# Altium footprint library cat.PcbLib: 78 footprints (part 4 of 5)
Each footprint in its own frame and in the unit in brackets; x right, y up, seen from the top. Pads: shape width x height; smd on the part's side, far side on the other; paste and mask are expansions set on the pad; w line width, h text height; cw(c..) or ccw(c..) is an arc to the next point about the centre after c.
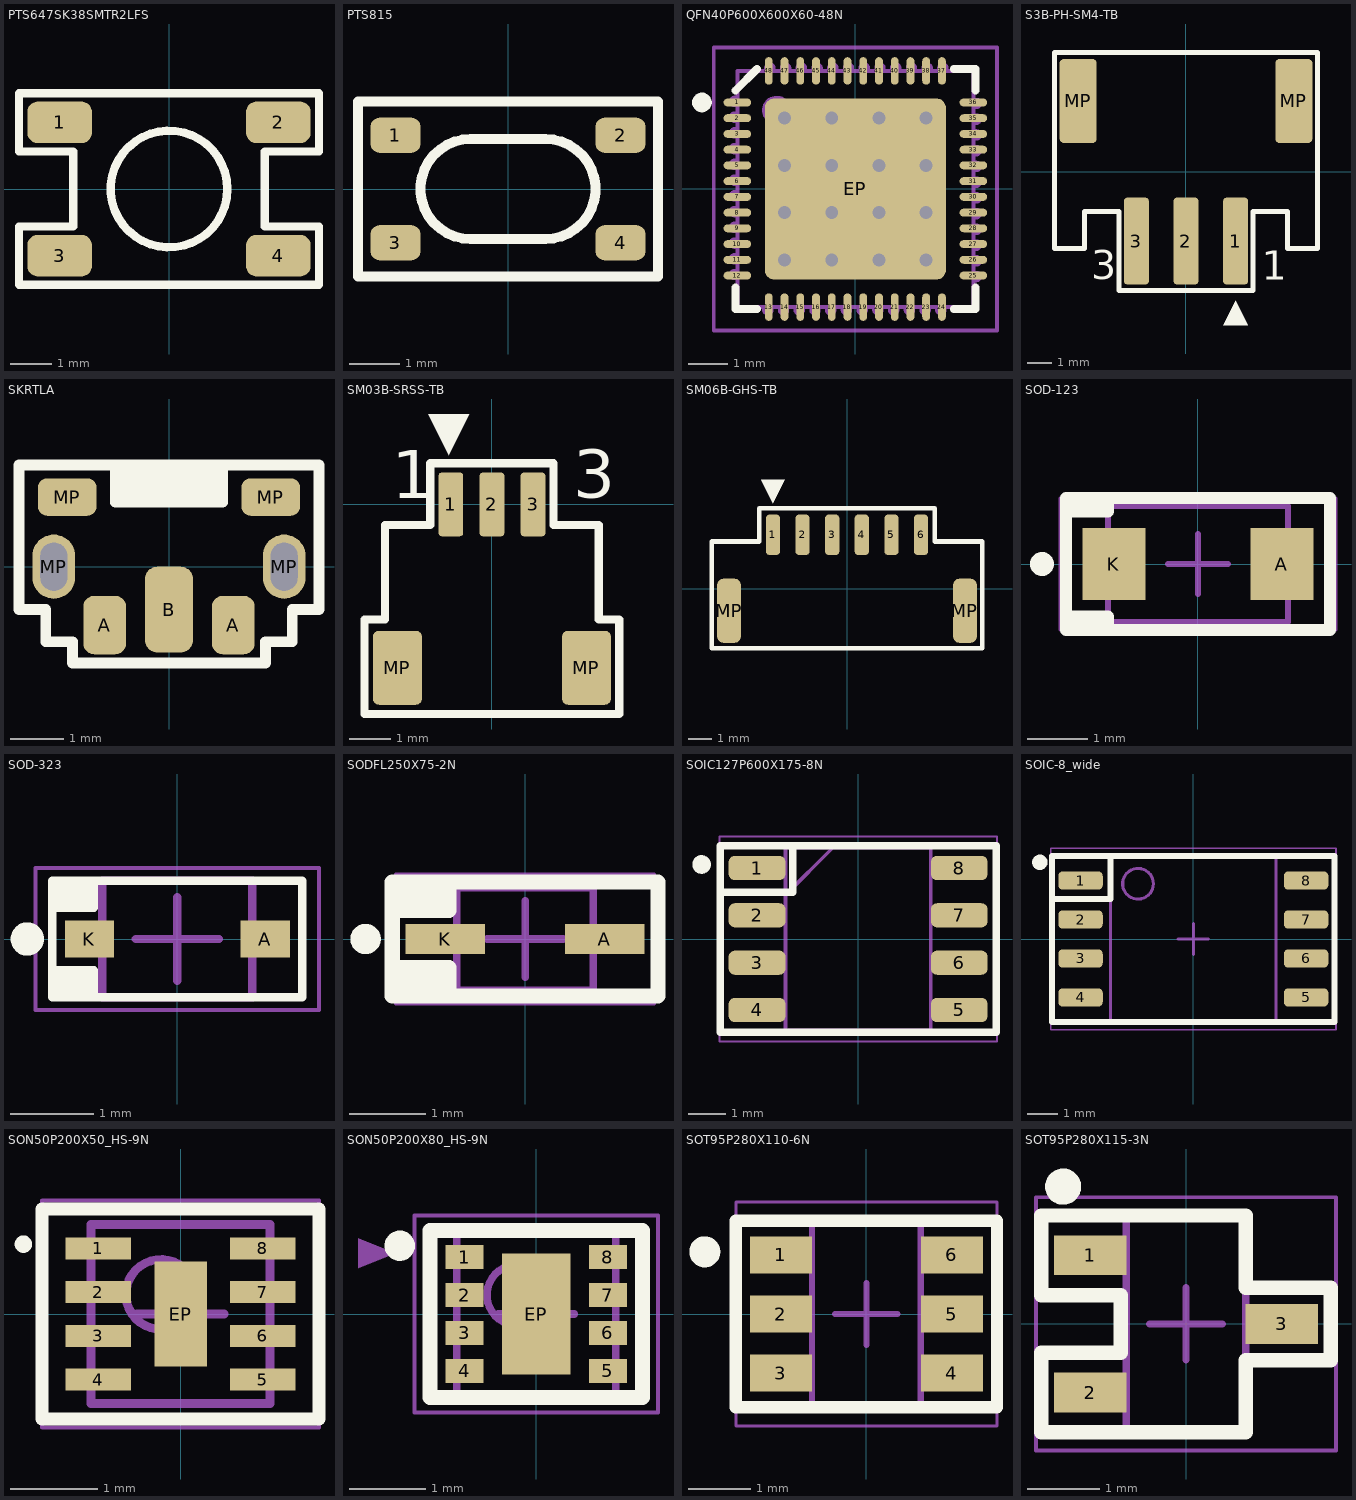
[diagram p3: the footprints below, top view; thin cyan lines are the x and y axes]

## PTS647SK38SMTR2LFS [mm]
pads (4):
  rrect50% 1.55x1 smd: 1(-2.625,1.6) 2(2.625,1.6) 3(-2.625,-1.6) 4(2.625,-1.6)
Top Overlay:
  circle w0.2: c0,0 r1.4
  lines w0.2: -3.6,-2.3 -3.6,-0.9 -2.3,-0.9 -2.3,0.9 -3.6,0.9 -3.6,2.3 3.6,2.3 3.6,0.9 2.3,0.9 2.3,-0.9 3.6,-0.9 3.6,-2.3 -3.6,-2.3
3D body "pts647sk38Smtr2lfs.step": height 3.8, standoff 0, extent -3.25,-2.25 3.25,2.25

## PTS815 [mm]
pads (4):
  rrect50% 1x0.7 smd: 1(-2.25,1.075) 2(2.25,1.075) 3(-2.25,-1.075) 4(2.25,-1.075)
Top Overlay:
  lines w0.2: -3,-1.75 3,-1.75 3,1.75 -3,1.75 -3,-1.75 ; -0.75,-1 cw(c-0.75,0) -0.75,1 0.75,1 cw(c0.75,0) 0.75,-1 -0.75,-1
3D body "PTS815.stp": height 2.5, standoff 0, extent -2.25,-1.6 2.25,1.6

## QFN40P600X600X60-48N [mm] "QFN, 48-Leads, Body 6.1x6.1mm (max), Pitch 0.40mm, IPC Medium Density"
height 0.6
pads (49):
  oval 0.7x0.2 smd: 1(-3,2.2) 2(-3,1.8) 3(-3,1.4) 4(-3,1) 5(-3,0.6) 6(-3,0.2) 7(-3,-0.2) 8(-3,-0.6) 9(-3,-1) 10(-3,-1.4) 11(-3,-1.8) 12(-3,-2.2) 25(3,-2.2) 26(3,-1.8) 27(3,-1.4) 28(3,-1) 29(3,-0.6) 30(3,-0.2) 31(3,0.2) 32(3,0.6) 33(3,1) 34(3,1.4) 35(3,1.8) 36(3,2.2)
  oval 0.2x0.7 smd: 13(-2.2,-3) 14(-1.8,-3) 15(-1.4,-3) 16(-1,-3) 17(-0.6,-3) 18(-0.2,-3) 19(0.2,-3) 20(0.6,-3) 21(1,-3) 22(1.4,-3) 23(1.8,-3) 24(2.2,-3) 37(2.2,3) 38(1.8,3) 39(1.4,3) 40(1,3) 41(0.6,3) 42(0.2,3) 43(-0.2,3) 44(-0.6,3) 45(-1,3) 46(-1.4,3) 47(-1.8,3) 48(-2.2,3)
  rrect10% 4.6x4.6 smd: EP(0,0)
via 1.8,-1.8 diameter 0.66 hole 0.33
via 0.6,-1.8 diameter 0.66 hole 0.33
via -0.6,-1.8 diameter 0.66 hole 0.33
via -1.8,-1.8 diameter 0.66 hole 0.33
via 1.8,-0.6 diameter 0.66 hole 0.33
via 0.6,-0.6 diameter 0.66 hole 0.33
via -0.6,-0.6 diameter 0.66 hole 0.33
via -1.8,-0.6 diameter 0.66 hole 0.33
via 1.8,0.6 diameter 0.66 hole 0.33
via 0.6,0.6 diameter 0.66 hole 0.33
via -0.6,0.6 diameter 0.66 hole 0.33
via -1.8,0.6 diameter 0.66 hole 0.33
via 1.8,1.8 diameter 0.66 hole 0.33
via 0.6,1.8 diameter 0.66 hole 0.33
via -0.6,1.8 diameter 0.66 hole 0.33
via -1.8,1.8 diameter 0.66 hole 0.33
Top Overlay:
  circle w0.25: c-3.9,2.2 r0.125
  lines w0.2: -3.05,-2.5 -3.05,-3.05 -2.5,-3.05 ; -3.05,2.5 -2.5,3.05 ; 2.5,-3.05 3.05,-3.05 3.05,-2.5 ; 2.5,3.05 3.05,3.05 3.05,2.5
Bottom Courtyard:
  circle w0.1: c-2,2 r0.32
  lines w0.1: -3,-2.269 -3.071,-2.269 cw(c-3.071,-2.174) -3.071,-2.079 -3,-2.079 ; -3,-1.869 -3.071,-1.869 cw(c-3.071,-1.774) -3.071,-1.679 -3,-1.679 ; -3,-1.469 -3.071,-1.469 cw(c-3.071,-1.374) -3.071,-1.279 -3,-1.279 ; -3,-1.069 -3.071,-1.069 cw(c-3.071,-0.974) -3.071,-0.879 -3,-0.879 ; -3,-0.669 -3.071,-0.669 cw(c-3.071,-0.574) -3.071,-0.479 -3,-0.479 ; -3,-0.269 -3.071,-0.269 cw(c-3.071,-0.174) -3.071,-0.079 -3,-0.079 ; -3,0.131 -3.071,0.131 cw(c-3.071,0.226) -3.071,0.321 -3,0.321 ; -3,0.531 -3.071,0.531 cw(c-3.071,0.626) -3.071,0.721 -3,0.721 ; -3,0.931 -3.071,0.931 cw(c-3.071,1.026) -3.071,1.121 -3,1.121 ; -3,1.331 -3.071,1.331 cw(c-3.071,1.426) -3.071,1.521 -3,1.521 ; -3,1.731 -3.071,1.731 cw(c-3.071,1.826) -3.071,1.921 -3,1.921 ; -3,2.131 -3.071,2.131 cw(c-3.071,2.226) -3.071,2.321 -3,2.321 ; -2.321,-3 -2.321,-3.071 ccw(c-2.226,-3.071) -2.131,-3.071 -2.131,-3 ; -2.269,3 -2.269,3.071 cw(c-2.174,3.071) -2.079,3.071 -2.079,3 ; -1.921,-3 -1.921,-3.071 ccw(c-1.826,-3.071) -1.731,-3.071 -1.731,-3 ; -1.869,3 -1.869,3.071 cw(c-1.774,3.071) -1.679,3.071 -1.679,3 ; -1.521,-3 -1.521,-3.071 ccw(c-1.426,-3.071) -1.331,-3.071 -1.331,-3 ; -1.469,3 -1.469,3.071 cw(c-1.374,3.071) -1.279,3.071 -1.279,3 ; -1.121,-3 -1.121,-3.071 ccw(c-1.026,-3.071) -0.931,-3.071 -0.931,-3 ; -1.069,3 -1.069,3.071 cw(c-0.974,3.071) -0.879,3.071 -0.879,3 ; -0.721,-3 -0.721,-3.071 ccw(c-0.626,-3.071) -0.531,-3.071 -0.531,-3 ; -0.669,3 -0.669,3.071 cw(c-0.574,3.071) -0.479,3.071 -0.479,3 ; -0.321,-3 -0.321,-3.071 ccw(c-0.226,-3.071) -0.131,-3.071 -0.131,-3 ; -0.269,3 -0.269,3.071 cw(c-0.174,3.071) -0.079,3.071 -0.079,3 ; 0.079,-3 0.079,-3.071 ccw(c0.174,-3.071) 0.269,-3.071 0.269,-3 ; 0.131,3 0.131,3.071 cw(c0.226,3.071) 0.321,3.071 0.321,3 ; 0.479,-3 0.479,-3.071 ccw(c0.574,-3.071) 0.669,-3.071 0.669,-3 ; 0.531,3 0.531,3.071 cw(c0.626,3.071) 0.721,3.071 0.721,3 ; 0.879,-3 0.879,-3.071 ccw(c0.974,-3.071) 1.069,-3.071 1.069,-3 ; 0.931,3 0.931,3.071 cw(c1.026,3.071) 1.121,3.071 1.121,3 ; 1.279,-3 1.279,-3.071 ccw(c1.374,-3.071) 1.469,-3.071 1.469,-3 ; 1.331,3 1.331,3.071 cw(c1.426,3.071) 1.521,3.071 1.521,3 ; 1.679,-3 1.679,-3.071 ccw(c1.774,-3.071) 1.869,-3.071 1.869,-3 ; 1.731,3 1.731,3.071 cw(c1.826,3.071) 1.921,3.071 1.921,3 ; 2.079,-3 2.079,-3.071 ccw(c2.174,-3.071) 2.269,-3.071 2.269,-3 ; 2.131,3 2.131,3.071 cw(c2.226,3.071) 2.321,3.071 2.321,3 ; 3,-2.321 3.071,-2.321 ccw(c3.071,-2.226) 3.071,-2.131 3,-2.131 ; 3,-1.921 3.071,-1.921 ccw(c3.071,-1.826) 3.071,-1.731 3,-1.731 ; 3,-1.521 3.071,-1.521 ccw(c3.071,-1.426) 3.071,-1.331 3,-1.331 ; 3,-1.121 3.071,-1.121 ccw(c3.071,-1.026) 3.071,-0.931 3,-0.931 ; 3,-0.721 3.071,-0.721 ccw(c3.071,-0.626) 3.071,-0.531 3,-0.531 ; 3,-0.321 3.071,-0.321 ccw(c3.071,-0.226) 3.071,-0.131 3,-0.131 ; 3,0.079 3.071,0.079 ccw(c3.071,0.174) 3.071,0.269 3,0.269 ; 3,0.479 3.071,0.479 ccw(c3.071,0.574) 3.071,0.669 3,0.669 ; 3,0.879 3.071,0.879 ccw(c3.071,0.974) 3.071,1.069 3,1.069 ; 3,1.279 3.071,1.279 ccw(c3.071,1.374) 3.071,1.469 3,1.469 ; 3,1.679 3.071,1.679 ccw(c3.071,1.774) 3.071,1.869 3,1.869 ; 3,2.079 3.071,2.079 ccw(c3.071,2.174) 3.071,2.269 3,2.269 ; -3,-3 3,-3 3,3 -3,3 -3,-3
  text ".Designator" at -1.1,-0.2 h0.38
Mechanical 15:
  lines w0.1: -0.5,0 0.5,0 ; 0,-0.5 0,0.5 ; -3.6,-3.6 3.6,-3.6 3.6,3.6 -3.6,3.6 -3.6,-3.6
3D body "User Library-QFN48.step": height 0.86, standoff -0.01, extent -3.02,-3.02 3.02,3.02

## S3B-PH-SM4-TB [mm]
pads (5):
  rrect25% 1x3.5 smd: 1(2,-2.8) 2(0,-2.8) 3(-2,-2.8)
  rrect25% 1.5x3.4 smd: MP(-4.35,2.85) MP(4.35,2.85)
Top Overlay:
  region: 2,-5.2 1.5,-6.2 2.5,-6.2
  lines w0.2: -5.3,-3.1 -4.1,-3.1 -4.1,-1.6 -2.7,-1.6 -2.7,-4.8 2.7,-4.8 2.7,-1.6 4.1,-1.6 4.1,-3.1 5.3,-3.1 5.3,4.8 -5.3,4.8 -5.3,2.8 -5.3,-3.1
  text "3" at -3.819,-4.731 h2
  text "1" at 3.064,-4.742 h2
3D body "s3b-ph-sm4-tb_connector.step": height 5.61, standoff 0.01, extent -4.95,-4.15 4.95,4.45

## SKRTLA [mm]
pads (7):
  rrect50% 0.8x1.09 smd: A(-1.2,-1.09) A(1.2,-1.09)
  rrect50% 0.9x1.6 smd: B(0,-0.8)
  oval 0.8x1.2 hole 0.5 slot 0.9 at 90 deg paste+0: MP(-2.15,0)
  rrect50% 1.1x0.7 smd: MP(-1.9,1.3) MP(1.9,1.3)
  oval 0.8x1.2 hole 0.5 slot 0.9 at 90 deg paste+0.012: MP(2.15,0)
Top Overlay:
  rectangle: -1,1.2 1,1.9
  lines w0.2: -1,1.9 -1,1.2 1,1.2 1,1.9 ; -2.8,-0.8 -2.8,1.9 2.8,1.9 2.8,-0.8 2.3,-0.8 2.3,-1.4 1.8,-1.4 1.8,-1.8 -1.8,-1.8 -1.8,-1.4 -2.3,-1.4 -2.3,-0.8 -2.8,-0.8
3D body "SKRTLA.STEP": height 3.35, standoff -0.45, extent -2.25,-1.5 2.25,2.05

## SM03B-SRSS-TB [mm]
pads (5):
  rrect25% 0.6x1.55 smd: 1(-1,0) 2(0,0) 3(1,0)
  rrect25% 1.2x1.8 smd: MP(-2.3,-3.975) MP(2.3,-3.975)
Top Overlay:
  region: -1.05,1.2 -0.55,2.2 -1.55,2.2
  lines w0.2: -3.1,-5.1 -3.1,-2.8 -2.6,-2.8 -2.6,-0.5 -1.5,-0.5 -1.5,1 1.5,1 1.5,-0.5 2.6,-0.5 2.6,-2.8 3.1,-2.8 3.1,-5.1 -3.1,-5.1
  text "3" at 1.981,-0.231 h2
  text "1" at -2.436,-0.242 h2
3D body "sm03b-srss-tb_connector.step": height 2.96, standoff 0, extent -2.5,-4.8 2.5,0.15

## SM06B-GHS-TB [mm]
pads (8):
  rrect50% 0.6x1.7 smd: 1(-3.12,2.28) 2(-1.872,2.28) 3(-0.624,2.28) 4(0.624,2.28) 5(1.872,2.28) 6(3.12,2.28)
  rrect50% 1x2.7 smd: MP(-4.97,-0.92) MP(4.97,-0.92)
Top Overlay:
  region: -2.62,4.6 -3.62,4.6 -3.12,3.6
  lines w0.2: -5.7,-2.5 -5.7,2 -3.7,2 -3.7,3.4 3.7,3.4 3.7,2 4.4,2 5.7,2 5.7,-2.4 5.7,-2.5 -5.7,-2.5
3D body "sm06B-ghs-tb_connector.sldprt": height 4.36, standoff 0.01, extent -5.375,-2.15 5.375,2.7

## SOD-123 [mm] "SODFL, 2-Leads, Body 1.78x3.70mm, IPC Medium Density"
height 1
pads (2):
  rect 1.05x1.2 smd: A(1.4,0) K(-1.4,0)
Top Overlay:
  circle w0.2: c-2.6,0 r0.1
  rectangle: -2.25,0.875 -1.5,1.125
  rectangle: -2.25,-1.125 -1.5,-0.875
  lines w0.2: -2.2,-0.875 -1.5,-0.875 -1.5,-1.1 ; -1.5,1.1 -1.5,0.875 -2.196,0.875 ; -2.196,0.875 -2.196,0.875 ; -2.2,-1.1 2.2,-1.1 2.2,1.1 -2.2,1.1 -2.2,-1.1
Mechanical 13:
  lines w0.1: -1.5,-0.965 -1.5,0.965 1.5,0.965 1.5,-0.965 -1.5,-0.965
Mechanical 15:
  lines w0.05: -2.3,-1.1 -2.3,1.1 2.3,1.1 2.3,-1.1 -2.3,-1.1
  lines w0.1: -0.5,0 0.5,0 ; 0,-0.5 0,0.5
3D body "PowerDI123.step": height 1, standoff 0, extent -1.85,-0.965 1.85,0.965

## SOD-323 [mm] "Diode Standard 75V 150mA Surface Mount SOD-323"
height 1.2
pads (2):
  rect 0.59x0.45 smd: A(1.055,0) K(-1.055,0)
Top Overlay:
  circle w0.2: c-1.8,0 r0.1
  rectangle: -1.5,-0.7 -1,-0.375
  rectangle: -1.5,0.375 -1,0.7
  lines w0.1: -1.5,-0.375 -1,-0.375 -1,-0.7 ; -1.5,0.375 -1,0.375 -1,0.7 ; -1.5,-0.7 1.5,-0.7 1.5,0.7 -1.5,0.7 -1.5,-0.7
Mechanical 13:
  lines w0.1: -0.9,-0.7 0.9,-0.7 0.9,0.7 -0.9,0.7 -0.9,-0.7
Mechanical 15:
  lines w0.05: -1.7,-0.85 1.7,-0.85 1.7,0.85 -1.7,0.85 -1.7,-0.85
  lines w0.1: -0.5,0 0.5,0 ; 0,-0.5 0,0.5
3D body "1N4148WS-7-F.step": height 1.2, standoff 0, extent -1.25,-0.7 1.25,0.7

## SODFL250X75-2N [mm] "SODFL, 2-Leads, Body 1.25x2.50mm, IPC Medium Density"
height 0.75
pads (2):
  rect 1.05x0.4 smd: A(1.05,0) K(-1.05,0)
Top Overlay:
  circle w0.2: c-2.1,0 r0.1
  lines w0.2: -1.75,-0.563 -1,-0.563 ; -1.75,-0.375 -1,-0.375 -1,-0.75 ; -1.75,0.375 -1,0.375 -1,0.75 ; -1.75,0.563 -1,0.563 ; -1.75,-0.75 -1.75,0.75 1.75,0.75 1.75,-0.75 -1.75,-0.75
Mechanical 13:
  lines w0.1: -0.9,-0.675 0.9,-0.675 0.9,0.675 -0.9,0.675 -0.9,-0.675
Mechanical 15:
  lines w0.05: -1.7,-0.85 1.7,-0.85 1.7,0.85 -1.7,0.85 -1.7,-0.85
  lines w0.1: -0.5,0 0.5,0 ; 0,-0.5 0,0.5
3D body "SODFL250X75-2N.step": height 0.75, standoff 0, extent -1.25,-0.675 1.25,0.675

## SOIC127P600X175-8N [mm]
pads (8):
  rrect50% 1.525x0.65 smd: 1(-2.712,1.905) 2(-2.712,0.635) 3(-2.712,-0.635) 4(-2.712,-1.905) 5(2.712,-1.905) 6(2.712,-0.635) 7(2.712,0.635) 8(2.712,1.905)
Top Overlay:
  circle w0.25: c-4.2,2 r0.125
  lines w0.2: -3.7,1.25 -1.75,1.25 -1.75,2.5 ; -3.7,-2.5 -3.7,2.5 3.7,2.5 3.7,-2.5 -3.7,-2.5
Mechanical 13:
  lines w0.1: -1.95,1.18 -0.68,2.45 ; -1.95,-2.45 1.95,-2.45 1.95,2.45 -1.95,2.45 -1.95,-2.45
Mechanical 15:
  lines w0.05: -3.725,-2.75 3.725,-2.75 3.725,2.75 -3.725,2.75 -3.725,-2.75
3D body "NE555DR.stp": height 1.75, standoff 0, extent -3,-2.45 3,2.45

## SOIC-8_wide [mm]
height 2.16
pads (8):
  rrect50% 1.45x0.6 smd: 1(-3.675,1.905) 2(-3.675,0.635) 3(-3.675,-0.635) 4(-3.675,-1.905) 5(3.675,-1.905) 6(3.675,-0.635) 7(3.675,0.635) 8(3.675,1.905)
Top Overlay:
  circle w0.25: c-5,2.5 r0.125
  lines w0.2: -4.6,1.3 -2.7,1.3 -2.7,2.7 ; -4.6,-2.7 -4.6,2.7 4.6,2.7 4.6,-2.7 -4.6,-2.7
Mechanical 13:
  circle w0.1: c-1.8,1.8 r0.5
  lines w0.1: -2.7,-2.7 -2.7,2.7 2.7,2.7 2.7,-2.7 -2.7,-2.7
Mechanical 15:
  lines w0.05: -4.65,-2.95 -4.65,2.95 4.65,2.95 4.65,-2.95 -4.65,-2.95
  lines w0.1: -0.5,0 0.5,0 ; 0,-0.5 0,0.5
3D body "SOIC-8_wide.step": height 2.16, standoff 0, extent -3.95,-2.7 3.95,2.7

## SON50P200X50_HS-9N [mm] "SON, 8-Leads, Body 2.00x2.00mm, Pitch 0.50mm, Thermal Pad 1.20x0.60mm, IPC Medium Density"
height 0.5
pads (9):
  rect 0.75x0.25 smd: 1(-0.94,0.75) 2(-0.94,0.25) 3(-0.94,-0.25) 4(-0.94,-0.75) 5(0.94,-0.75) 6(0.94,-0.25) 7(0.94,0.25) 8(0.94,0.75)
  rect 0.6x1.2 smd: EP(0,0)
Top Overlay:
  circle w0.1: c-1.8,0.8 r0.05
  lines w0.15: -1.585,-1.2 1.585,-1.2 1.585,1.2 -1.585,1.2 -1.585,-1.2
Top Assembly:
  circle w0.1: c-0.225,0.225 r0.4
  lines w0.1: -1.025,-1.025 -1.025,1.025 1.025,1.025 1.025,-1.025 -1.025,-1.025
Top Courtyard:
  lines w0.05: -1.585,-1.3 -1.585,1.3 1.585,1.3 1.585,-1.3 -1.585,-1.3
  lines w0.1: -0.5,0 0.5,0 ; 0,-0.5 0,0.5
3D body "SON50P200X50_HS-9N.step": height 0.5, standoff 0, extent -1.026,-1.025 1.026,1.025

## SON50P200X80_HS-9N [mm] "SON, 8-Leads, Body 2.00x2.00mm, Pitch 0.50mm, Thermal Pad 1.60x0.69mm, IPC Medium Density"
height 0.8
pads (9):
  rect 0.5x0.32 smd: 1(-0.945,0.75) 2(-0.945,0.25) 3(-0.945,-0.25) 4(-0.945,-0.75) 5(0.945,-0.75) 6(0.945,-0.25) 7(0.945,0.25) 8(0.945,0.75)
  rect 0.9x1.6 smd: EP(0,0)
Top Overlay:
  circle w0.2: c-1.8,0.9 r0.1
  lines w0.2: -1.4,-1.1 -1.4,1.1 1.4,1.1 1.4,-1.1 -1.4,-1.1
Mechanical 1:
  region: -1.85,0.8 -2.35,1 -2.35,0.6
Mechanical 13:
  circle w0.1: c-0.25,0.25 r0.4
  lines w0.1: -1.05,-1.05 -1.05,1.05 1.05,1.05 1.05,-1.05 -1.05,-1.05
Mechanical 15:
  lines w0.05: -1.605,-1.3 -1.605,1.3 1.605,1.3 1.605,-1.3 -1.605,-1.3
  lines w0.1: -0.5,0 0.5,0 ; 0,-0.5 0,0.5
3D body "SON50P200X80_HS-9N.step": height 0.8, standoff 0, extent -1.051,-1.05 1.051,1.05

## SOT95P280X110-6N [mm] "SOT23, 6-Leads, Body 2,90x2,80mm, Pitch 0,95mm, IPC Medium Density"
height 1.1
pads (6):
  rect 1x0.6 smd: 1(-1.375,0.95) 2(-1.375,0) 3(-1.375,-0.95) 4(1.375,-0.95) 5(1.375,0) 6(1.375,0.95)
Top Overlay:
  circle w0.25: c-2.6,1 r0.125
  lines w0.2: -2.1,-1.5 -2.1,1.5 2.1,1.5 2.1,-1.5 -2.1,-1.5
Mechanical 13:
  lines w0.1: -0.875,-1.525 0.875,-1.525 0.875,1.525 -0.875,1.525 -0.875,-1.525
Mechanical 15:
  lines w0.05: -2.1,-1.8 2.1,-1.8 2.1,1.8 -2.1,1.8 -2.1,-1.8
  lines w0.1: -0.5,0 0.5,0 ; 0,-0.5 0,0.5
3D body: height 1.1, standoff 0.15, extent -0.875,-1.525 0.875,1.525

## SOT95P280X115-3N [mm] "SOT23, 3-Leads, Body 2.92x2.80mm, Pitch 0.95mm, IPC Medium Density"
height 1.15
pads (3):
  rect 1x0.55 smd: 1(-1.325,0.95) 2(-1.325,-0.95) 3(1.325,0)
Top Overlay:
  circle w0.25: c-1.7,1.9 r0.125
  lines w0.2: -2,-1.5 -2,-0.4 -0.9,-0.4 -0.9,0.4 -2,0.4 -2,1.5 0.825,1.5 0.825,0.5 2,0.5 2,-0.5 0.825,-0.5 0.825,-1.5 -2,-1.5
Mechanical 13:
  lines w0.1: -0.825,-1.485 0.825,-1.485 0.825,1.485 -0.825,1.485 -0.825,-1.485
Mechanical 15:
  lines w0.05: -2.075,-1.75 2.075,-1.75 2.075,1.75 -2.075,1.75 -2.075,-1.75
  lines w0.1: -0.5,0 0.5,0 ; 0,-0.5 0,0.5
3D body "SOT95P280X115-3N.step": height 1.15, standoff 0, extent -1.45,-1.485 1.45,1.485